# Altium footprint library LION.PcbLib: 90 footprints (part 1 of 13)
Each footprint in its own frame and in the unit in brackets; x right, y up, seen from the top. Pads: shape width x height; smd on the part's side, far side on the other; paste and mask are expansions set on the pad; w line width, h text height; cw(c..) or ccw(c..) is an arc to the next point about the centre after c.
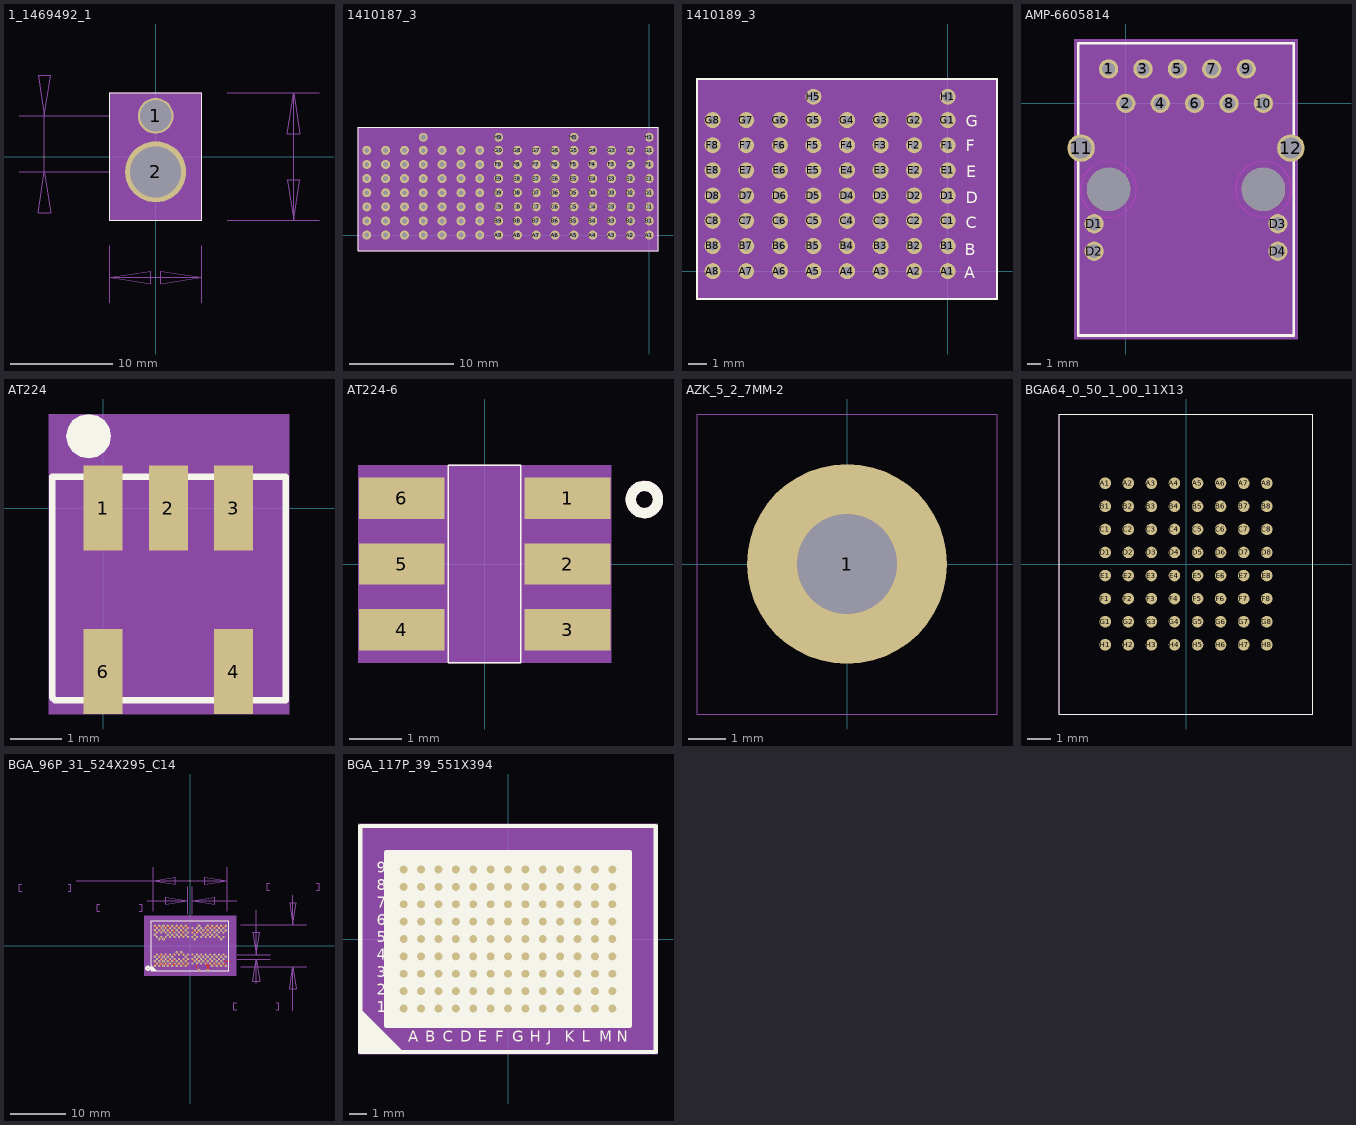
[diagram p0: the footprints below, top view; thin cyan lines are the x and y axes]

## 1_1469492_1 [mm] "1_1469492_1"
pads (2):
  round 3.5 hole 3.1: 1(0,4)
  round 6 / inner round 5.8 / far side round 6 hole 5: 2(0,-1.5)
Top Overlay:
  lines w0.025: -4.5,-6.25 -4.5,6.25 4.5,6.25 4.5,-6.25 -4.5,-6.25
  text ".Designator" at 0,0 h0.64
Mechanical 5:
  lines w0.025: -4.5,-6.25 -4.5,6.25 4.5,6.25 4.5,-6.25 -4.5,-6.25
  text "ZK3" at 2.519,2.054 h0.64
Mechanical 13:
  lines w0.025: -13.414,-1.5 -2.5,-1.5 ; -13.414,4 -2.5,4 ; -4.5,-14.364 -4.5,-8.75 ; 4.5,-14.364 4.5,-8.75 ; 7,-6.25 16.029,-6.25 ; 7,6.25 16.029,6.25 ; -10.914,-1.5 -11.539,-5.5 -10.289,-5.5 -10.914,-1.5 ; -10.914,-1.5 -10.914,0.372 -10.914,4 ; -10.914,4 -10.289,8 -11.539,8 -10.914,4 ; -4.5,-11.864 -0.5,-12.489 -0.5,-11.239 -4.5,-11.864 ; -4.5,-11.864 0.232,-11.864 4.5,-11.864 ; 4.5,-11.864 0.5,-11.239 0.5,-12.489 4.5,-11.864 ; 13.529,-6.25 14.154,-2.25 12.904,-2.25 13.529,-6.25 ; 13.529,-6.25 13.529,0.025 13.529,6.25 ; 13.529,6.25 12.904,2.25 14.154,2.25 13.529,6.25
  text "5.5" at -12.501,-3.958 h3.17
  text "9" at -0.949,-10.277 h3.17
  text "12.5" at 11.942,-5.88 h3.17
Mechanical 14:
  text "2" at 0,-1.297 h0.51
  text "1" at 0,4.203 h0.51
Mechanical 16:
  region: -4.5,-6.25 4.5,-6.25 4.5,6.25 -4.5,6.25
  pour cut-out: -4.5,-6.25 4.5,-6.25 4.5,6.25 -4.5,6.25
  lines w0.025: -4.5,-6.25 -4.5,6.25 4.5,6.25 4.5,-6.25 -4.5,-6.25
3D body: height 3.81, standoff 0, extent -4.5,-6.25 4.5,6.25

## 1410187_3 [mm] "1410187_3"
pads (116):
  round 0.86 hole 0.46: A1(0,0) A2(-1.8,0) A3(-3.6,0) A4(-5.4,0) A5(-7.2,0) A6(-9,0) A7(-10.8,0) A8(-12.6,0) A9(-14.4,0) A10(-16.2,0) A11(-18,0) A12(-19.8,0) A13(-21.6,0) A14(-23.4,0) A15(-25.2,0) A16(-27,0) B1(0,1.35) B2(-1.8,1.35) B3(-3.6,1.35) B4(-5.4,1.35) B5(-7.2,1.35) B6(-9,1.35) B7(-10.8,1.35) B8(-12.6,1.35) B9(-14.4,1.35) B10(-16.2,1.35) B11(-18,1.35) B12(-19.8,1.35) B13(-21.6,1.35) B14(-23.4,1.35) B15(-25.2,1.35) B16(-27,1.35) C1(0,2.7) C2(-1.8,2.7) C3(-3.6,2.7) C4(-5.4,2.7) C5(-7.2,2.7) C6(-9,2.7) C7(-10.8,2.7) C8(-12.6,2.7) C9(-14.4,2.7) C10(-16.2,2.7) C11(-18,2.7) C12(-19.8,2.7) C13(-21.6,2.7) C14(-23.4,2.7) C15(-25.2,2.7) C16(-27,2.7) D1(0,4.05) D2(-1.8,4.05) D3(-3.6,4.05) D4(-5.4,4.05) D5(-7.2,4.05) D6(-9,4.05) D7(-10.8,4.05) D8(-12.6,4.05) D9(-14.4,4.05) D10(-16.2,4.05) D11(-18,4.05) D12(-19.8,4.05) D13(-21.6,4.05) D14(-23.4,4.05) D15(-25.2,4.05) D16(-27,4.05) E1(0,5.4) E2(-1.8,5.4) E3(-3.6,5.4) E4(-5.4,5.4) E5(-7.2,5.4) E6(-9,5.4) E7(-10.8,5.4) E8(-12.6,5.4) E9(-14.4,5.4) E10(-16.2,5.4) E11(-18,5.4) E12(-19.8,5.4) E13(-21.6,5.4) E14(-23.4,5.4) E15(-25.2,5.4) E16(-27,5.4) F1(0,6.75) F2(-1.8,6.75) F3(-3.6,6.75) F4(-5.4,6.75) F5(-7.2,6.75) F6(-9,6.75) F7(-10.8,6.75) F8(-12.6,6.75) F9(-14.4,6.75) F10(-16.2,6.75) F11(-18,6.75) F12(-19.8,6.75) F13(-21.6,6.75) F14(-23.4,6.75) F15(-25.2,6.75) F16(-27,6.75) G1(0,8.1) G2(-1.8,8.1) G3(-3.6,8.1) G4(-5.4,8.1) G5(-7.2,8.1) G6(-9,8.1) G7(-10.8,8.1) G8(-12.6,8.1) G9(-14.4,8.1) G10(-16.2,8.1) G11(-18,8.1) G12(-19.8,8.1) G13(-21.6,8.1) G14(-23.4,8.1) G15(-25.2,8.1) G16(-27,8.1)
  round 0.86 hole 0.56: H1(0,9.35) H5(-7.2,9.35) H9(-14.4,9.35) H13(-21.6,9.35)
Top Overlay:
  lines w0.1: -27.84,-1.5 0.84,-1.5 0.84,10.31 -27.84,10.31 -27.84,-1.5
  text ".Designator" at -20.738,11.425 h0.64
Mechanical 5:
  lines w0.1: -27.84,-1.5 0.84,-1.5 0.84,10.31 -27.84,10.31 -27.84,-1.5
  text "VPX5" at -20.738,11.425 h0.64
Mechanical 14:
  text "B9" at -14.4,1.756 h0.51
  text "A9" at -14.4,0.406 h0.51
  text "C8" at -12.6,3.106 h0.51
  text "B8" at -12.6,1.756 h0.51
  text "E15" at -25.2,6.009 h0.51
  text "D15" at -25.2,4.659 h0.51
  text "G9" at -14.4,8.506 h0.51
  text "G11" at -18,8.709 h0.51
  text "G13" at -21.6,8.709 h0.51
  text "G15" at -25.2,8.709 h0.51
  text "D5" at -7.2,4.456 h0.51
  text "D11" at -18,4.659 h0.51
  text "D3" at -3.6,4.456 h0.51
  text "F6" at -9,7.156 h0.51
  text "B5" at -7.2,1.756 h0.51
  text "B10" at -16.2,1.959 h0.51
  text "A1" at 0,0.406 h0.51
  text "B4" at -5.4,1.756 h0.51
  text "E3" at -3.6,5.806 h0.51
  text "E11" at -18,6.009 h0.51
  text "E9" at -14.4,5.806 h0.51
  text "F12" at -19.8,7.359 h0.51
  text "A11" at -18,0.61 h0.51
  text "E10" at -16.2,6.009 h0.51
  text "C10" at -16.2,3.309 h0.51
  text "E5" at -7.2,5.806 h0.51
  text "C4" at -5.4,3.106 h0.51
  text "D9" at -14.4,4.456 h0.51
  text "F4" at -5.4,7.156 h0.51
  text "E12" at -19.8,6.009 h0.51
  text "E6" at -9,5.806 h0.51
  text "B2" at -1.8,1.756 h0.51
  text "A5" at -7.2,0.406 h0.51
  text "E2" at -1.8,5.806 h0.51
  text "E4" at -5.4,5.806 h0.51
  text "C2" at -1.8,3.106 h0.51
  text "D1" at 0,4.456 h0.51
  text "B6" at -9,1.756 h0.51
  text "C12" at -19.8,3.309 h0.51
  text "B3" at -3.6,1.756 h0.51
  text "C6" at -9,3.106 h0.51
  text "F10" at -16.2,7.359 h0.51
  text "A3" at -3.6,0.406 h0.51
  text "B11" at -18,1.959 h0.51
  text "F2" at -1.8,7.156 h0.51
  text "E1" at 0,5.806 h0.51
  text "B16" at -27,1.959 h0.51
  text "C16" at -27,3.309 h0.51
  text "E16" at -27,6.009 h0.51
  text "F16" at -27,7.359 h0.51
  text "B12" at -19.8,1.959 h0.51
  text "B1" at 0,1.756 h0.51
  text "A13" at -21.6,0.61 h0.51
  text "B13" at -21.6,1.959 h0.51
  text "D13" at -21.6,4.659 h0.51
  text "E13" at -21.6,6.009 h0.51
  text "B14" at -23.4,1.959 h0.51
  text "C14" at -23.4,3.309 h0.51
  text "E14" at -23.4,6.009 h0.51
  text "F14" at -23.4,7.359 h0.51
  text "A15" at -25.2,0.61 h0.51
  text "B15" at -25.2,1.959 h0.51
  text "F8" at -12.6,7.156 h0.51
  text "E8" at -12.6,5.806 h0.51
  text "E7" at -10.8,5.806 h0.51
  text "D7" at -10.8,4.456 h0.51
  text "B7" at -10.8,1.756 h0.51
  text "A7" at -10.8,0.406 h0.51
  text "G7" at -10.8,8.506 h0.51
  text "G5" at -7.2,8.506 h0.51
  text "G3" at -3.6,8.506 h0.51
  text "G1" at 0,8.506 h0.51
  text "H1" at 0,9.756 h0.51
  text "H5" at -7.2,9.756 h0.51
  text "H9" at -14.4,9.756 h0.51
  text "H13" at -21.6,9.959 h0.51
  text "D16" at -27,4.659 h0.51
  text "G16" at -27,8.709 h0.51
  text "A16" at -27,0.61 h0.51
  text "C11" at -18,3.309 h0.51
  text "C13" at -21.6,3.309 h0.51
  text "C15" at -25.2,3.309 h0.51
  text "D12" at -19.8,4.659 h0.51
  text "D14" at -23.4,4.659 h0.51
  text "F11" at -18,7.359 h0.51
  text "F13" at -21.6,7.359 h0.51
  text "F15" at -25.2,7.359 h0.51
  text "G12" at -19.8,8.709 h0.51
  text "G14" at -23.4,8.709 h0.51
  text "A12" at -19.8,0.61 h0.51
  text "A14" at -23.4,0.61 h0.51
  text "C7" at -10.8,3.106 h0.51
  text "C9" at -14.4,3.106 h0.51
  text "D6" at -9,4.456 h0.51
  text "D8" at -12.6,4.456 h0.51
  text "D10" at -16.2,4.659 h0.51
  text "F7" at -10.8,7.156 h0.51
  text "F9" at -14.4,7.156 h0.51
  text "G6" at -9,8.506 h0.51
  text "G8" at -12.6,8.506 h0.51
  text "G10" at -16.2,8.709 h0.51
  text "A6" at -9,0.406 h0.51
  text "A8" at -12.6,0.406 h0.51
  text "A10" at -16.2,0.61 h0.51
  text "C1" at 0,3.106 h0.51
  text "C3" at -3.6,3.106 h0.51
  text "C5" at -7.2,3.106 h0.51
  text "D2" at -1.8,4.456 h0.51
  text "D4" at -5.4,4.456 h0.51
  text "F1" at 0,7.156 h0.51
  text "F3" at -3.6,7.156 h0.51
  text "F5" at -7.2,7.156 h0.51
  text "G2" at -1.8,8.506 h0.51
  text "G4" at -5.4,8.506 h0.51
  text "A2" at -1.8,0.406 h0.51
  text "A4" at -5.4,0.406 h0.51
Mechanical 16:
  pour cut-out: -27.84,-1.5 0.84,-1.5 0.84,10.31 -27.84,10.31
  region: -27.84,-1.5 0.84,-1.5 0.84,10.31 -27.84,10.31
  lines w0.025: -27.84,-1.5 0.84,-1.5 0.84,10.31 -27.84,10.31 -27.84,-1.5
3D body: height 3.81, standoff 0, extent -27.84,-1.5 0.84,10.31

## 1410189_3 [mm] "1410189_3"
pads (58):
  round 0.86 hole 0.46: A1(0,0) A2(-1.8,0) A3(-3.6,0) A4(-5.4,0) A5(-7.2,0) A6(-9,0) A7(-10.8,0) A8(-12.6,0) B1(0,1.35) B2(-1.8,1.35) B3(-3.6,1.35) B4(-5.4,1.35) B5(-7.2,1.35) B6(-9,1.35) B7(-10.8,1.35) B8(-12.6,1.35) C1(0,2.7) C2(-1.8,2.7) C3(-3.6,2.7) C4(-5.4,2.7) C5(-7.2,2.7) C6(-9,2.7) C7(-10.8,2.7) C8(-12.6,2.7) D1(0,4.05) D2(-1.8,4.05) D3(-3.6,4.05) D4(-5.4,4.05) D5(-7.2,4.05) D6(-9,4.05) D7(-10.8,4.05) D8(-12.6,4.05) E1(0,5.4) E2(-1.8,5.4) E3(-3.6,5.4) E4(-5.4,5.4) E5(-7.2,5.4) E6(-9,5.4) E7(-10.8,5.4) E8(-12.6,5.4) F1(0,6.75) F2(-1.8,6.75) F3(-3.6,6.75) F4(-5.4,6.75) F5(-7.2,6.75) F6(-9,6.75) F7(-10.8,6.75) F8(-12.6,6.75) G1(0,8.1) G2(-1.8,8.1) G3(-3.6,8.1) G4(-5.4,8.1) G5(-7.2,8.1) G6(-9,8.1) G7(-10.8,8.1) G8(-12.6,8.1)
  round 0.86 hole 0.56: H1(0,9.35) H5(-7.2,9.35)
Top Overlay:
  lines w0.1: -13.44,-1.5 -13.44,10.31 2.64,10.31 2.64,-1.5 -13.44,-1.5
  text ".Designator" at -5.396,11.044 h0.64
  text "A" at 0.873,-0.39 h0.64
  text "B" at 0.917,0.848 h0.64
  text "C" at 0.961,2.307 h0.64
  text "D" at 0.961,3.633 h0.64
  text "E" at 1.005,5.048 h0.64
  text "F" at 0.961,6.418 h0.64
  text "G" at 0.961,7.744 h0.64
Mechanical 5:
  lines w0.1: -13.44,-1.5 2.64,-1.5 2.64,10.31 -13.44,10.31 -13.44,-1.5
  text "G" at 0.961,7.744 h0.64
  text "F" at 0.961,6.418 h0.64
  text "E" at 1.005,5.048 h0.64
  text "D" at 0.961,3.633 h0.64
  text "C" at 0.961,2.307 h0.64
  text "B" at 0.917,0.848 h0.64
  text "A" at 0.873,-0.39 h0.64
  text "VPX4" at -5.396,11.044 h0.64
Mechanical 14:
  text "A1" at 0,0.406 h0.51
  text "A2" at -1.8,0.406 h0.51
  text "B1" at 0,1.756 h0.51
  text "B2" at -1.8,1.756 h0.51
  text "C1" at 0,3.106 h0.51
  text "C2" at -1.8,3.106 h0.51
  text "E1" at 0,5.806 h0.51
  text "E2" at -1.8,5.806 h0.51
  text "F1" at 0,7.156 h0.51
  text "F2" at -1.8,7.156 h0.51
  text "G1" at 0,8.506 h0.51
  text "G2" at -1.8,8.506 h0.51
  text "B8" at -12.6,1.756 h0.51
  text "G3" at -3.6,8.506 h0.51
  text "F3" at -3.6,7.156 h0.51
  text "C3" at -3.6,3.106 h0.51
  text "A3" at -3.6,0.406 h0.51
  text "B3" at -3.6,1.756 h0.51
  text "E3" at -3.6,5.806 h0.51
  text "B5" at -7.2,1.756 h0.51
  text "F4" at -5.4,7.156 h0.51
  text "G4" at -5.4,8.506 h0.51
  text "A5" at -7.2,0.406 h0.51
  text "F5" at -7.2,7.156 h0.51
  text "G6" at -9,8.506 h0.51
  text "F6" at -9,7.156 h0.51
  text "B6" at -9,1.756 h0.51
  text "A6" at -9,0.406 h0.51
  text "G5" at -7.2,8.506 h0.51
  text "D5" at -7.2,4.456 h0.51
  text "A4" at -5.4,0.406 h0.51
  text "B4" at -5.4,1.756 h0.51
  text "D6" at -9,4.456 h0.51
  text "D4" at -5.4,4.456 h0.51
  text "D1" at 0,4.456 h0.51
  text "D2" at -1.8,4.456 h0.51
  text "D3" at -3.6,4.456 h0.51
  text "F8" at -12.6,7.156 h0.51
  text "C8" at -12.6,3.106 h0.51
  text "H1" at 0,9.756 h0.51
  text "H5" at -7.2,9.756 h0.51
  text "D7" at -10.8,4.456 h0.51
  text "E7" at -10.8,5.806 h0.51
  text "A7" at -10.8,0.406 h0.51
  text "C7" at -10.8,3.106 h0.51
  text "D8" at -12.6,4.456 h0.51
  text "E8" at -12.6,5.806 h0.51
  text "F7" at -10.8,7.156 h0.51
  text "G7" at -10.8,8.506 h0.51
  text "G8" at -12.6,8.506 h0.51
  text "A8" at -12.6,0.406 h0.51
  text "B7" at -10.8,1.756 h0.51
  text "C4" at -5.4,3.106 h0.51
  text "C5" at -7.2,3.106 h0.51
  text "C6" at -9,3.106 h0.51
  text "E4" at -5.4,5.806 h0.51
  text "E5" at -7.2,5.806 h0.51
  text "E6" at -9,5.806 h0.51
Mechanical 16:
  region: -13.44,-1.5 2.64,-1.5 2.64,10.309 -13.44,10.309
  lines w0.025: -13.44,-1.5 2.64,-1.5 2.64,10.309 -13.44,10.309 -13.44,-1.5
3D body: height 3.81, standoff 0, extent -13.44,-1.5 2.64,10.309

## AMP-6605814 [mil] "AMP-6605814"
pads (18):
  round 56 hole 38: 1(-50,100) 2(0,0) 3(50,100) 4(100,0) 5(150,100) 6(200,0) 7(250,100) 8(300,0) 9(350,100) 10(400,0) D1(-92,-350) D2(-92,-430) D3(442,-350) D4(442,-430)
  round 80 hole 62: 11(-130,-130) 12(480,-130)
  round 126 hole 126: " "(-50,-250) " "(400,-250)
Top Overlay:
  lines w8: -138,-675 488,-675 488,175 -138,175 -138,-675
  text ".Designator" at -163.97,-41.8 h25
Mechanical 5:
  lines w8: -138,-173.26 -138,-675 488,-675 488,-173.26 ; -138,-86.74 -138,175 488,175 488,-86.74
  text "J6" at -163.97,-41.8 h25
Mechanical 14:
  text "12" at 480,-158 h35
  text "11" at -130,-158 h35
  text "D2" at -92,-458 h35
  text "2" at 0,-14 h35
  text "D4" at 442,-458 h35
  text "4" at 100,-14 h35
  text "10" at 400,-28 h35
  text "9" at 350,86 h35
  text "5" at 150,86 h35
  text "6" at 200,-14 h35
  text "3" at 50,86 h35
  text "8" at 300,-14 h35
  text "7" at 250,86 h35
  text "D3" at 442,-378 h35
  text "D1" at -92,-378 h35
  text "1" at -50,86 h35
Mechanical 16:
  region: 500,187 500,-685 -150,-685 -150,187
  lines w1: -138,-675 -138,175 ; -138,-675 488,-675 ; -138,-675 488,-675 ; -138,-675 -138,175 ; -138,175 488,175 ; -138,175 488,175 ; 488,-675 488,175 ; 488,-675 488,175
Multi-Layer keep-out:
  circle w1: c-50,-250 r81
  circle w1: c400,-250 r81
Mechanical 17:
  text "6605814-6" at 0,-500 h40
3D body: height 150, standoff 0, extent -150,-685 500,187

## AT224 [mm] "AT224"
pads (5):
  rect 0.76x1.65 smd: 1(0,0) 2(1.27,0) 3(2.54,0) 4(2.54,-3.18) 6(0,-3.18)
Top Overlay:
  pour cut-out: -0.71,1.397 -0.678,1.232 -0.584,1.092 -0.444,0.999 -0.279,0.966 -0.114,0.999 0.025,1.092 0.119,1.232 0.152,1.397 0.119,1.562 0.025,1.702 -0.114,1.795 -0.279,1.828 -0.444,1.795 -0.584,1.702 -0.678,1.562
  lines w0.127: -0.991,-3.683 -0.94,-3.734 3.556,-3.734 3.556,0.61 -0.991,0.61 -0.991,-3.683
Mechanical 5:
  lines w0.127: -0.443,-3.734 -0.94,-3.734 -0.991,-3.683 -0.991,0.61 -0.443,0.61 ; 0.443,-3.734 2.097,-3.734 ; 0.443,0.61 0.827,0.61 ; 1.713,0.61 2.097,0.61 ; 2.983,-3.734 3.556,-3.734 3.556,0.61 2.983,0.61
Mechanical 14:
  text "4" at 3.048,-3.18 h0.64
  text "2" at 1.778,0 h0.64
  text "6" at 0.508,-3.18 h0.64
  text "3" at 3.048,0 h0.64
  text "1" at 0.508,0 h0.64
Mechanical 16:
  region: -1.054,-4.005 3.619,-4.005 3.619,1.82 -1.054,1.82
3D body: height 3.81, standoff 0, extent -1.054,-4.005 3.619,1.82

## AT224-6 [mil] "AT224-6"
pads (6):
  rect 65x31.5 smd: 1(62.99,50) 2(62.99,0) 3(62.99,-50) 4(-62.99,-50) 5(-62.99,0) 6(-62.99,50)
Top Overlay:
  circle w7.87: c121.39,48.97 r10.31
  lines w1: -27.56,-74.8 27.56,-74.8 27.56,74.8 -27.56,74.8 -27.56,-74.8
Mechanical 5:
  lines w1: -27.56,-74.8 27.56,-74.8 27.56,74.8 -27.56,74.8 -27.56,-74.8
  lines w7.87: 131.07,45.41 cw(c121.39,48.97) 121.39,38.66 cw(c121.39,48.97) 111.08,48.97 cw(c121.39,48.97) 121.39,59.28 cw(c121.39,48.97) 131.07,52.53
  text "T1" at 14.95,90.16 h25
Mechanical 14:
  text "5" at -62.99,-24.88 h31.1
  text "1" at 62.99,26.38 h59.06
  text "6" at -62.99,26.38 h59.06
  text "4" at -62.99,-73.62 h59.06
  text "2" at 62.99,-23.62 h59.06
  text "3" at 62.99,-73.62 h59.06
Mechanical 16:
  pour cut-out: -96.07,-74.8 96.06,-74.8 96.06,74.8 -96.07,74.8
  region: -96.07,-74.8 96.06,-74.8 96.06,74.8 -96.07,74.8
  lines w1: -27.56,-74.8 27.56,-74.8 27.56,74.8 -27.56,74.8 -27.56,-74.8
Mechanical 17:
  text ".Designator" at 153.59,-53.58 h25
3D body: height 150, standoff 0, extent -96.07,-74.8 96.06,74.8

## AZK_5_2_7MM-2 [mil] "AZK_5_2_7MM-2"
pads (1):
  round 212.6 / inner round 125.98 / far side round 212.6 hole 106.3: 1(0,0)
Mechanical 14:
  text "1" at -8,0 h20
Mechanical 16:
  pour cut-out: 100.48,0 98.55,19.6 92.83,38.45 83.55,55.83 71.05,71.05 55.83,83.55 38.45,92.83 19.6,98.55 0,100.48 -19.6,98.55 -38.45,92.83 -55.83,83.55 -71.05,71.05 -83.55,55.83 -92.83,38.45 -98.55,19.6 -100.48,0 -98.55,-19.6 -92.83,-38.45 -83.55,-55.83 -71.05,-71.05 -55.83,-83.55 -38.45,-92.83 -19.6,-98.55 0,-100.48 19.6,-98.55 38.45,-92.83 55.83,-83.55 71.05,-71.05 83.55,-55.83 92.83,-38.45 98.55,-19.6
  lines w1: -159.45,-159.45 159.45,-159.45 159.45,159.45 -159.45,159.45 -159.45,-159.45
3D body: height 150, standoff 0, extent -100.48,-100.48 100.48,100.48

## BGA64_0_50_1_00_11X13 [mil] "BGA64_0_50_1_00_11X13"
pads (64):
  round 19.68 smd: A1(-137.8,137.8) A2(-98.43,137.8) A3(-59.06,137.8) A4(-19.69,137.8) A5(19.69,137.8) A6(59.06,137.8) A7(98.43,137.8) A8(137.8,137.8) B1(-137.8,98.43) B2(-98.43,98.43) B3(-59.06,98.43) B4(-19.69,98.43) B5(19.69,98.43) B6(59.06,98.43) B7(98.43,98.43) B8(137.8,98.43) C1(-137.8,59.06) C2(-98.43,59.06) C3(-59.06,59.06) C4(-19.69,59.06) C5(19.69,59.06) C6(59.06,59.06) C7(98.43,59.06) C8(137.8,59.06) D1(-137.8,19.69) D2(-98.43,19.69) D3(-59.06,19.69) D4(-19.69,19.69) D5(19.69,19.69) D6(59.06,19.69) D7(98.43,19.69) D8(137.8,19.69) E1(-137.8,-19.69) E2(-98.43,-19.69) E3(-59.06,-19.69) E4(-19.69,-19.69) E5(19.69,-19.69) E6(59.06,-19.69) E7(98.43,-19.69) E8(137.8,-19.69) F1(-137.8,-59.06) F2(-98.43,-59.06) F3(-59.06,-59.06) F4(-19.69,-59.06) F5(19.69,-59.06) F6(59.06,-59.06) F7(98.43,-59.06) F8(137.8,-59.06) G1(-137.8,-98.43) G2(-98.43,-98.43) G3(-59.06,-98.43) G4(-19.69,-98.43) G5(19.69,-98.43) G6(59.06,-98.43) G7(98.43,-98.43) G8(137.8,-98.43) H1(-137.8,-137.8) H2(-98.43,-137.8) H3(-59.06,-137.8) H4(-19.69,-137.8) H5(19.69,-137.8) H6(59.06,-137.8) H7(98.43,-137.8) H8(137.8,-137.8)
Top Overlay:
  lines w1: -216.54,-255.91 216.54,-255.91 216.54,255.91 -216.54,255.91 -216.54,-255.91
Mechanical 5:
  lines w1: -216.54,-255.91 216.54,-255.91 216.54,255.91 -216.54,255.91 -216.54,-255.91
  text "U7" at -7.57,269.12 h25
Mechanical 14:
  text "F1" at -153.8,-59.06 h20
  text "D8" at 121.8,19.69 h20
  text "A1" at -153.8,137.8 h20
  text "A8" at 121.8,137.8 h20
  text "H1" at -153.8,-137.8 h20
  text "H8" at 121.8,-137.8 h20
  text "C1" at -153.8,59.06 h20
  text "D1" at -153.8,19.69 h20
  text "E1" at -153.8,-19.69 h20
  text "G1" at -153.8,-98.43 h20
  text "G8" at 121.8,-98.43 h20
  text "F8" at 121.8,-59.06 h20
  text "B1" at -153.8,98.43 h20
  text "F7" at 82.43,-59.06 h20
  text "B4" at -35.69,98.43 h20
  text "B5" at 3.69,98.43 h20
  text "C8" at 121.8,59.06 h20
  text "E2" at -114.43,-19.69 h20
  text "B8" at 121.8,98.43 h20
  text "C5" at 3.69,59.06 h20
  text "D4" at -35.69,19.69 h20
  text "D5" at 3.69,19.69 h20
  text "C4" at -35.69,59.06 h20
  text "B3" at -75.06,98.43 h20
  text "H3" at -75.06,-137.8 h20
  text "E4" at -35.69,-19.69 h20
  text "H4" at -35.69,-137.8 h20
  text "E6" at 43.06,-19.69 h20
  text "H5" at 3.69,-137.8 h20
  text "B7" at 82.43,98.43 h20
  text "H6" at 43.06,-137.8 h20
  text "A7" at 82.43,137.8 h20
  text "E5" at 3.69,-19.69 h20
  text "E3" at -75.06,-19.69 h20
  text "B2" at -114.43,98.43 h20
  text "D6" at 43.06,19.69 h20
  text "B6" at 43.06,98.43 h20
  text "D2" at -114.43,19.69 h20
  text "E7" at 82.43,-19.69 h20
  text "C3" at -75.06,59.06 h20
  text "A6" at 43.06,137.8 h20
  text "D3" at -75.06,19.69 h20
  text "D7" at 82.43,19.69 h20
  text "A3" at -75.06,137.8 h20
  text "A2" at -114.43,137.8 h20
  text "C6" at 43.06,59.06 h20
  text "C2" at -114.43,59.06 h20
  text "C7" at 82.43,59.06 h20
  text "G2" at -114.43,-98.43 h20
  text "A5" at 3.69,137.8 h20
  text "F4" at -35.69,-59.06 h20
  text "G7" at 82.43,-98.43 h20
  text "F6" at 43.06,-59.06 h20
  text "A4" at -35.69,137.8 h20
  text "F2" at -114.43,-59.06 h20
  text "G4" at -35.69,-98.43 h20
  text "F5" at 3.69,-59.06 h20
  text "F3" at -75.06,-59.06 h20
  text "G3" at -75.06,-98.43 h20
  text "G6" at 43.06,-98.43 h20
  text "G5" at 3.69,-98.43 h20
  text "H2" at -114.43,-137.8 h20
  text "E8" at 121.8,-19.69 h20
  text "H7" at 82.43,-137.8 h20
Mechanical 16:
  lines w1: -216.54,-255.91 216.54,-255.91 ; -216.54,-255.91 -216.54,255.91 ; -216.54,-255.91 216.54,-255.91 ; -216.54,-255.91 -216.54,255.91 ; -216.54,-255.91 216.54,-255.91 ; -216.54,-255.91 -216.54,255.91 ; -216.54,255.91 216.54,255.91 ; -216.54,255.91 216.54,255.91 ; -216.54,255.91 216.54,255.91 ; 216.54,-255.91 216.54,255.91 ; 216.54,-255.91 216.54,255.91 ; 216.54,-255.91 216.54,255.91
Mechanical 17:
  text ".Designator" at -39.99,-16.67 h50

## BGA_96P_31_524X295_C14 [mil] "BGA_96P_31_524X295_C14"
pads (96):
  round 14 smd: A1(-236.22,-125.98) A2(-236.22,-94.49) A3(-236.22,-62.99) A7(-236.22,62.99) A8(-236.22,94.49) A9(-236.22,125.98) B1(-204.72,-125.98) B2(-204.72,-94.49) B3(-204.72,-62.99) B7(-204.72,62.99) B8(-204.72,94.49) B9(-204.72,125.98) C1(-173.23,-125.98) C2(-173.23,-94.49) C3(-173.23,-62.99) C7(-173.23,62.99) C8(-173.23,94.49) C9(-173.23,125.98) D1(-141.73,-125.98) D2(-141.73,-94.49) D3(-141.73,-62.99) D7(-141.73,62.99) D8(-141.73,94.49) D9(-141.73,125.98) E1(-110.24,-125.98) E2(-110.24,-94.49) E3(-110.24,-62.99) E7(-110.24,62.99) E8(-110.24,94.49) E9(-110.24,125.98) F1(-78.74,-125.98) F2(-78.74,-94.49) F3(-78.74,-62.99) F7(-78.74,62.99) F8(-78.74,94.49) F9(-78.74,125.98) G1(-47.24,-125.98) G2(-47.24,-94.49) G3(-47.24,-62.99) G7(-47.24,62.99) G8(-47.24,94.49) G9(-47.24,125.98) H1(-15.75,-125.98) H2(-15.75,-94.49) H3(-15.75,-62.99) H7(-15.75,62.99) H8(-15.75,94.49) H9(-15.75,125.98) J1(15.75,-125.98) J2(15.75,-94.49) J3(15.75,-62.99) J7(15.75,62.99) J8(15.75,94.49) J9(15.75,125.98) K1(47.24,-125.98) K2(47.24,-94.49) K3(47.24,-62.99) K7(47.24,62.99) K8(47.24,94.49) K9(47.24,125.98) L1(78.74,-125.98) L2(78.74,-94.49) L3(78.74,-62.99) L7(78.74,62.99) L8(78.74,94.49) L9(78.74,125.98) M1(110.24,-125.98) M2(110.24,-94.49) M3(110.24,-62.99) M7(110.24,62.99) M8(110.24,94.49) M9(110.24,125.98) N1(141.73,-125.98) N2(141.73,-94.49) N3(141.73,-62.99) N7(141.73,62.99) N8(141.73,94.49) N9(141.73,125.98) P1(173.23,-125.98) P2(173.23,-94.49) P3(173.23,-62.99) P7(173.23,62.99) P8(173.23,94.49) P9(173.23,125.98) R1(204.72,-125.98) R2(204.72,-94.49) R3(204.72,-62.99) R7(204.72,62.99) R8(204.72,94.49) R9(204.72,125.98) T1(236.22,-125.98) T2(236.22,-94.49) T3(236.22,-62.99) T7(236.22,62.99) T8(236.22,94.49) T9(236.22,125.98)
via 220.46,-141.72 diameter 18 hole 10
via 220.46,141.72 diameter 18 hole 10
via -94.48,-141.72 diameter 18 hole 10
via -157.47,-110.23 diameter 18 hole 10
via -251.96,-141.72 diameter 18 hole 10
via -220.46,-110.23 diameter 18 hole 10
via -188.97,-141.72 diameter 18 hole 10
via -31.49,-110.23 diameter 18 hole 10
via 62.98,110.23 diameter 18 hole 10
via -125.98,141.72 diameter 18 hole 10
via -157.47,141.72 diameter 18 hole 10
via -188.97,141.72 diameter 18 hole 10
via -251.96,110.23 diameter 18 hole 10
via -62.98,78.73 diameter 18 hole 10
via -31.49,141.72 diameter 18 hole 10
via 62.98,-110.23 diameter 18 hole 10
via 157.47,-141.72 diameter 18 hole 10
via 157.47,141.72 diameter 18 hole 10
via -31.49,-141.72 diameter 18 hole 10
via 125.98,110.23 diameter 18 hole 10
via -157.47,-78.73 diameter 18 hole 10
via -125.98,78.73 diameter 18 hole 10
via 125.98,-110.23 diameter 18 hole 10
via 62.98,141.72 diameter 18 hole 10
via 62.98,-78.73 diameter 18 hole 10
via 31.49,78.73 diameter 18 hole 10
via 31.49,47.24 diameter 18 hole 10
via 31.49,-78.73 diameter 18 hole 10
via 94.49,-78.74 diameter 18 hole 10
via 125.98,-78.73 diameter 18 hole 10
via 94.48,-110.23 diameter 18 hole 10
via 157.47,110.23 diameter 18 hole 10
via 94.48,110.23 diameter 18 hole 10
via -188.97,47.24 diameter 18 hole 10
via -62.98,-47.24 diameter 18 hole 10
via 62.98,-173.21 diameter 18 hole 10
via 220.46,-110.23 diameter 18 hole 10
via 220.46,47.24 diameter 18 hole 10
via 94.49,78.74 diameter 18 hole 10
via -31.49,110.23 diameter 18 hole 10
via -220.46,110.23 diameter 18 hole 10
via 188.97,-78.73 diameter 18 hole 10
via -188.97,110.23 diameter 18 hole 10
via -94.48,-110.23 diameter 18 hole 10
via 157.47,-78.73 diameter 18 hole 10
via 220.46,110.23 diameter 18 hole 10
via -31.49,78.73 diameter 18 hole 10
via -251.96,-110.23 diameter 18 hole 10
via -62.98,-110.23 diameter 18 hole 10
via 157.47,-110.23 diameter 18 hole 10
via -188.97,-110.23 diameter 18 hole 10
via 251.97,-78.74 diameter 18 hole 10
via 188.97,78.73 diameter 18 hole 10
via 251.96,110.23 diameter 18 hole 10
via -157.47,78.73 diameter 18 hole 10
via -188.97,-78.73 diameter 18 hole 10
via 125.98,78.73 diameter 18 hole 10
via -94.49,78.74 diameter 18 hole 10
via 157.47,78.73 diameter 18 hole 10
via 220.46,-78.73 diameter 18 hole 10
via -94.48,110.23 diameter 18 hole 10
via -251.97,78.74 diameter 18 hole 10
via -251.97,-78.74 diameter 18 hole 10
via -125.98,-78.73 diameter 18 hole 10
via 188.97,-110.23 diameter 18 hole 10
via -31.49,-78.73 diameter 18 hole 10
via 188.97,110.23 diameter 18 hole 10
via -94.49,-47.25 diameter 18 hole 10
via -220.46,47.24 diameter 18 hole 10
via -220.46,-141.72 diameter 18 hole 10
via -157.47,-141.72 diameter 18 hole 10
via -125.98,-110.23 diameter 18 hole 10
via -125.98,-141.72 diameter 18 hole 10
via -62.98,-141.72 diameter 18 hole 10
via -157.47,110.23 diameter 18 hole 10
via -125.98,110.23 diameter 18 hole 10
via -94.48,141.72 diameter 18 hole 10
via -62.98,141.72 diameter 18 hole 10
via -62.98,110.23 diameter 18 hole 10
via -220.46,-78.73 diameter 18 hole 10
via -220.46,141.72 diameter 18 hole 10
via -251.96,141.72 diameter 18 hole 10
via 31.49,-110.23 diameter 18 hole 10
via 125.98,-173.21 diameter 18 hole 10
via 188.97,-141.72 diameter 18 hole 10
via 251.96,-141.72 diameter 18 hole 10
via 31.49,110.23 diameter 18 hole 10
via 125.98,141.72 diameter 18 hole 10
via 188.97,141.72 diameter 18 hole 10
via 251.96,141.72 diameter 18 hole 10
Top Layer:
  lines w5: -251.96,-110.23 -236.22,-94.49 ; -251.97,-78.74 -236.22,-62.99 ; -251.97,78.74 -236.22,62.99 ; -220.46,110.23 -204.72,94.49 ; -204.72,62.99 -220.46,47.25 ; -188.97,-110.23 -173.23,-94.49 ; -188.97,-78.73 -173.23,-62.99 ; -188.97,110.23 -173.23,94.49 ; -173.23,62.99 -188.97,47.25 ; -157.47,-78.73 -141.73,-62.99 ; -157.47,78.73 -141.73,62.99 ; -125.98,-78.73 -110.24,-62.99 ; -125.98,78.73 -110.24,62.99 ; -94.48,-110.23 -78.74,-94.49 ; -94.49,78.74 -78.74,62.99 ; -94.48,110.23 -78.74,94.49 ; -78.74,-62.99 -94.48,-47.25 ; -62.98,-110.23 -47.24,-94.49 ; -47.24,-62.99 -62.98,-47.25 ; -31.49,-78.73 -15.75,-62.99 ; -31.49,78.73 -15.75,62.99 ; -31.49,110.23 -15.75,94.49 ; 15.75,62.99 31.49,78.73 ; 31.49,47.24 47.24,62.99 ; 47.24,125.98 62.98,141.72 ; 78.74,62.99 94.49,78.74 ; 78.74,94.49 94.48,110.23 ; 141.73,62.99 157.47,78.73 ; 141.73,94.49 157.47,110.23 ; 173.23,62.99 188.97,78.73 ; 173.23,94.49 188.97,110.23 ; 204.72,62.99 220.46,47.25 ; 204.72,94.49 220.46,110.23 ; 236.22,94.49 251.96,110.23 ; -220.46,47.24 -220.46,47.25 ; -188.97,47.24 -188.97,47.25 ; -94.49,-47.25 -94.48,-47.25 ; -62.98,-47.25 -62.98,-47.24 ; 220.46,47.24 220.46,47.25
  lines w6: 15.75,-62.99 31.49,-78.73 ; 47.24,-125.98 47.24,-157.47 62.98,-173.21 ; 47.24,-62.99 62.98,-78.73 ; 78.74,-94.49 94.48,-110.23 ; 78.74,-62.99 94.49,-78.74 ; 110.24,-94.49 125.98,-110.23 ; 110.24,-62.99 125.98,-78.73 ; 110.24,62.99 125.98,78.73 ; 141.73,-94.49 157.47,-110.23 ; 141.73,-62.99 157.47,-78.73 ; 173.23,-94.49 188.97,-110.23 ; 173.23,-62.99 188.97,-78.73 ; 204.72,-94.49 220.46,-110.23 ; 204.72,-62.99 220.46,-78.73 ; 236.22,-94.49 251.96,-110.23 283.45,-110.23 ; 236.22,-62.99 251.97,-78.74
  lines w15: -251.96,-141.72 -236.22,-125.98 ; -251.96,110.23 -236.22,94.49 ; -251.96,141.72 -236.22,125.98 ; -220.46,-141.72 -204.72,-125.98 ; -220.46,-110.23 -204.72,-94.49 ; -220.46,-78.73 -204.72,-62.99 ; -220.46,141.72 -204.72,125.98 ; -188.97,-141.72 -173.23,-125.98 ; -188.97,141.72 -173.23,125.98 ; -157.47,-141.72 -141.73,-125.98 ; -157.47,-110.23 -141.73,-94.49 ; -157.47,110.23 -141.73,94.49 ; -157.47,141.72 -141.73,125.98 ; -125.98,-141.72 -110.24,-125.98 ; -125.98,-110.23 -110.24,-94.49 ; -125.98,110.23 -110.24,94.49 ; -125.98,141.72 -110.24,125.98 ; -94.48,-141.72 -78.74,-125.98 ; -94.48,141.72 -78.74,125.98 ; -62.98,-141.72 -47.24,-125.98 ; -62.98,78.73 -47.24,62.99 ; -62.98,110.23 -47.24,94.49 ; -62.98,141.72 -47.24,125.98 ; -31.49,-141.72 -15.75,-125.98 ; -31.49,-110.23 -15.75,-94.49 ; -31.49,141.72 -15.75,125.98 ; 15.75,-94.49 31.49,-110.23 ; 15.75,94.49 31.49,110.23 ; 47.24,-94.49 62.98,-110.23 ; 47.24,94.49 62.98,110.23 ; 110.24,-125.98 125.98,-141.72 125.98,-173.21 ; 110.24,94.49 125.98,110.23 ; 110.24,125.98 125.98,141.72 ; 141.73,-125.98 157.47,-141.72 ; 141.73,125.98 157.47,141.72 ; 173.23,-125.98 188.97,-141.72 ; 173.23,125.98 188.97,141.72 ; 204.72,-125.98 220.46,-141.72 ; 204.72,125.98 220.46,141.72 ; 236.22,-125.98 251.96,-141.72 ; 236.22,125.98 251.96,141.72
Top Overlay:
  circle w15: c-300,-160 r11.18
  lines w3.94: -275.98,-142.52 -275.2,-142.52 -241.73,-175.98 -248.82,-175.98 -275.2,-149.61 -275.2,-156.3 -255.12,-176.38 -261.42,-176.38 -274.41,-163.39 -274.41,-170.08 -268.11,-176.38 ; -275.59,-177.16 275.59,-177.16 275.59,177.16 -275.59,177.16 -275.59,-177.16
  text ".Designator" at -327.51,-7.51 h25
Mechanical 1:
  lines w1: -261.81,-147.64 261.81,-147.64 261.81,147.64 -261.81,147.64 -261.81,-147.64
Mechanical 5:
  circle w15: c-300,-160 r11.18
  lines w3.94: -275.98,-142.52 -275.2,-142.52 -241.73,-175.98 -248.82,-175.98 -275.2,-149.61 -275.2,-156.3 -255.12,-176.38 -261.42,-176.38 -274.41,-163.39 -274.41,-170.08 -268.11,-176.38 ; -275.59,-177.16 275.59,-177.16 275.59,177.16 -275.59,177.16 -275.59,-177.16
  text "U4" at -362.51,27.5 h25
Mechanical 13:
  lines w1: -1195.67,385.04 -1214.57,385.04 -1214.57,435.04 -1195.67,435.04 ; -864.57,385.04 -845.67,385.04 -845.67,435.04 -864.57,435.04 ; -807.87,459.84 -261.81,459.84 ; -640.16,244.88 -659.06,244.88 -659.06,294.88 -640.16,294.88 ; -359.84,244.88 -340.94,244.88 -340.94,294.88 -359.84,294.88 ; -303.54,320.08 -15.75,320.08 ; -261.81,246.06 -261.81,558.27 ; -15.75,224.41 -15.75,418.5 ; 15.75,224.41 15.75,418.5 ; 261.81,246.06 261.81,558.27 ; 329.92,-455.12 311.02,-455.12 311.02,-405.12 329.92,-405.12 ; 330.71,320.08 15.75,320.08 ; 334.65,-94.49 568.5,-94.49 ; 334.65,-62.99 568.5,-62.99 ; 360.24,-147.64 828.35,-147.64 ; 360.24,147.64 828.35,147.64 ; 470.08,-267.32 470.08,-94.49 ; 470.08,251.97 470.08,-62.99 ; 564.57,394.88 545.67,394.88 545.67,444.88 564.57,444.88 ; 609.84,-455.12 629.13,-455.12 629.13,-405.12 609.84,-405.12 ; 729.92,-462.6 729.92,-147.64 ; 729.92,357.48 729.92,147.64 ; 895.67,394.88 914.57,394.88 914.57,444.88 895.67,444.88 ; -261.81,459.84 -104.33,484.65 -104.33,435.43 -261.81,459.84 ; -261.81,459.84 261.81,459.84 ; -15.75,320.08 -173.23,295.28 -173.23,344.49 -15.75,320.08 ; 15.75,320.08 173.23,344.49 173.23,295.28 15.75,320.08 ; 261.81,459.84 104.33,435.43 104.33,484.65 261.81,459.84 ; 470.08,-94.49 494.49,-251.97 445.28,-251.97 470.08,-94.49 ; 470.08,-62.99 445.28,94.49 494.49,94.49 470.08,-62.99 ; 729.92,-147.64 754.72,-305.12 705.51,-305.12 729.92,-147.64 ; 729.92,147.64 705.51,305.12 754.72,305.12 729.92,147.64
  text "0.8" at -570.08,344.88 h50
  text "31.50" at -620.87,244.88 h50
  text "0.8" at 400,-355.12 h50
  text "31.50" at 348.82,-455.12 h50
  text "13.3" at -1125.59,485.04 h50
  text "523.62" at -1176.38,385.04 h50
  text "7.5" at 659.84,494.88 h50
  text "295.28" at 583.46,394.88 h50
Mechanical 14:
  text "R1" at 204.72,-105.82 h25.2
  text "R9" at 204.72,146.14 h25.2
  text "F1" at -78.74,-105.82 h25.2
  text "D2" at -141.73,-74.33 h25.2
  text "A1" at -236.22,-105.82 h25.2
  text "B2" at -204.72,-74.33 h25.2
  text "C1" at -173.23,-105.82 h25.2
  text "H2" at -15.75,-74.33 h25.2
  text "K8" at 47.24,114.65 h25.2
  text "E9" at -110.24,146.14 h25.2
  text "D9" at -141.73,146.14 h25.2
  text "C9" at -173.23,146.14 h25.2
  text "A8" at -236.22,114.65 h25.2
  text "G7" at -47.24,83.15 h25.2
  text "H9" at -15.75,146.14 h25.2
  text "K2" at 47.24,-74.33 h25.2
  text "N1" at 141.73,-105.82 h25.2
  text "N9" at 141.73,146.14 h25.2
  text "H1" at -15.75,-105.82 h25.2
  text "M8" at 110.24,114.65 h25.2
  text "D3" at -141.73,-42.83 h25.2
  text "E7" at -110.24,83.15 h25.2
  text "M2" at 110.24,-74.33 h25.2
  text "K9" at 47.24,146.14 h25.2
  text "K3" at 47.24,-42.83 h25.2
  text "J7" at 15.75,83.15 h25.2
  text "K7" at 47.24,83.15 h25.2
  text "J3" at 15.75,-42.83 h25.2
  text "L3" at 78.74,-42.83 h25.2
  text "M3" at 110.24,-42.83 h25.2
  text "L2" at 78.74,-74.33 h25.2
  text "N8" at 141.73,114.65 h25.2
  text "L8" at 78.74,114.65 h25.2
  text "C7" at -173.23,83.15 h25.2
  text "G3" at -47.24,-42.83 h25.2
  text "K1" at 47.24,-105.82 h25.2
  text "T7" at 236.22,83.15 h25.2
  text "R2" at 204.72,-74.33 h25.2
  text "R7" at 204.72,83.15 h25.2
  text "L7" at 78.74,83.15 h25.2
  text "H8" at -15.75,114.65 h25.2
  text "B8" at -204.72,114.65 h25.2
  text "T2" at 236.22,-74.33 h25.2
  text "P3" at 173.23,-42.83 h25.2
  text "C8" at -173.23,114.65 h25.2
  text "F2" at -78.74,-74.33 h25.2
  text "N3" at 141.73,-42.83 h25.2
  text "R8" at 204.72,114.65 h25.2
  text "H7" at -15.75,83.15 h25.2
  text "A2" at -236.22,-74.33 h25.2
  text "G2" at -47.24,-74.33 h25.2
  text "N2" at 141.73,-74.33 h25.2
  text "C2" at -173.23,-74.33 h25.2
  text "T3" at 236.22,-42.83 h25.2
  text "P7" at 173.23,83.15 h25.2
  text "T8" at 236.22,114.65 h25.2
  text "D7" at -141.73,83.15 h25.2
  text "C3" at -173.23,-42.83 h25.2
  text "M7" at 110.24,83.15 h25.2
  text "F7" at -78.74,83.15 h25.2
  text "N7" at 141.73,83.15 h25.2
  text "R3" at 204.72,-42.83 h25.2
  text "F8" at -78.74,114.65 h25.2
  text "A7" at -236.22,83.15 h25.2
  text "A3" at -236.22,-42.83 h25.2
  text "E3" at -110.24,-42.83 h25.2
  text "P2" at 173.23,-74.33 h25.2
  text "H3" at -15.75,-42.83 h25.2
  text "P8" at 173.23,114.65 h25.2
  text "F3" at -78.74,-42.83 h25.2
  text "B7" at -204.72,83.15 h25.2
  text "J1" at 15.75,-105.82 h25.2
  text "J9" at 15.75,146.14 h25.2
  text "L1" at 78.74,-105.82 h25.2
  text "L9" at 78.74,146.14 h25.2
  text "B1" at -204.72,-105.82 h25.2
  text "D1" at -141.73,-105.82 h25.2
  text "E2" at -110.24,-74.33 h25.2
  text "E1" at -110.24,-105.82 h25.2
  text "G1" at -47.24,-105.82 h25.2
  text "D8" at -141.73,114.65 h25.2
  text "E8" at -110.24,114.65 h25.2
  text "F9" at -78.74,146.14 h25.2
  text "G9" at -47.24,146.14 h25.2
  text "G8" at -47.24,114.65 h25.2
  text "B3" at -204.72,-42.83 h25.2
  text "B9" at -204.72,146.14 h25.2
  text "A9" at -236.22,146.14 h25.2
  text "J2" at 15.75,-74.33 h25.2
  text "M1" at 110.24,-105.82 h25.2
  text "P1" at 173.23,-105.82 h25.2
  text "T1" at 236.22,-105.82 h25.2
  text "J8" at 15.75,114.65 h25.2
  text "M9" at 110.24,146.14 h25.2
  text "P9" at 173.23,146.14 h25.2
  text "T9" at 236.22,146.14 h25.2
Mechanical 16:
  pour cut-out: -325.98,-211.81 325.98,-211.81 325.98,211.81 -325.98,211.81
  region: -285,-185 285,-185 285,185 -285,185
3D body: height 150, standoff 0, extent -285,-185 285,185

## BGA_117P_39_551X394 [mil] "BGA_117P_39_551X394"
pads (117):
  round 18 smd: A1(-236.22,-157.48) A2(-236.22,-118.11) A3(-236.22,-78.74) A4(-236.22,-39.37) A5(-236.22,0) A6(-236.22,39.37) A7(-236.22,78.74) A8(-236.22,118.11) A9(-236.22,157.48) B1(-196.85,-157.48) B2(-196.85,-118.11) B3(-196.85,-78.74) B4(-196.85,-39.37) B5(-196.85,0) B6(-196.85,39.37) B7(-196.85,78.74) B8(-196.85,118.11) B9(-196.85,157.48) C1(-157.48,-157.48) C2(-157.48,-118.11) C3(-157.48,-78.74) C4(-157.48,-39.37) C5(-157.48,0) C6(-157.48,39.37) C7(-157.48,78.74) C8(-157.48,118.11) C9(-157.48,157.48) D1(-118.11,-157.48) D2(-118.11,-118.11) D3(-118.11,-78.74) D4(-118.11,-39.37) D5(-118.11,0) D6(-118.11,39.37) D7(-118.11,78.74) D8(-118.11,118.11) D9(-118.11,157.48) E1(-78.74,-157.48) E2(-78.74,-118.11) E3(-78.74,-78.74) E4(-78.74,-39.37) E5(-78.74,0) E6(-78.74,39.37) E7(-78.74,78.74) E8(-78.74,118.11) E9(-78.74,157.48) F1(-39.37,-157.48) F2(-39.37,-118.11) F3(-39.37,-78.74) F4(-39.37,-39.37) F5(-39.37,0) F6(-39.37,39.37) F7(-39.37,78.74) F8(-39.37,118.11) F9(-39.37,157.48) G1(0,-157.48) G2(0,-118.11) G3(0,-78.74) G4(0,-39.37) G5(0,0) G6(0,39.37) G7(0,78.74) G8(0,118.11) G9(0,157.48) H1(39.37,-157.48) H2(39.37,-118.11) H3(39.37,-78.74) H4(39.37,-39.37) H5(39.37,0) H6(39.37,39.37) H7(39.37,78.74) H8(39.37,118.11) H9(39.37,157.48) J1(78.74,-157.48) J2(78.74,-118.11) J3(78.74,-78.74) J4(78.74,-39.37) J5(78.74,0) J6(78.74,39.37) J7(78.74,78.74) J8(78.74,118.11) J9(78.74,157.48) K1(118.11,-157.48) K2(118.11,-118.11) K3(118.11,-78.74) K4(118.11,-39.37) K5(118.11,0) K6(118.11,39.37) K7(118.11,78.74) K8(118.11,118.11) K9(118.11,157.48) L1(157.48,-157.48) L2(157.48,-118.11) L3(157.48,-78.74) L4(157.48,-39.37) L5(157.48,0) L6(157.48,39.37) L7(157.48,78.74) L8(157.48,118.11) L9(157.48,157.48) M1(196.85,-157.48) M2(196.85,-118.11) M3(196.85,-78.74) M4(196.85,-39.37) M5(196.85,0) M6(196.85,39.37) M7(196.85,78.74) M8(196.85,118.11) M9(196.85,157.48) N1(236.22,-157.48) N2(236.22,-118.11) N3(236.22,-78.74) N4(236.22,-39.37) N5(236.22,0) N6(236.22,39.37) N7(236.22,78.74) N8(236.22,118.11) N9(236.22,157.48)
Top Overlay:
  drawing of 127 lines, arcs and shapes, not listed
  text "9" at -297.09,149.61 h25
  text "8" at -297.09,110.24 h25
  text "7" at -297.09,70.87 h25
  text "6" at -297.09,31.5 h25
  text "5" at -297.09,-7.87 h25
  text "4" at -297.09,-47.24 h25
  text "3" at -297.09,-86.61 h25
  text "2" at -297.09,-125.98 h25
  text "N" at 246.22,-232.28 h25
  text "M" at 206.85,-232.28 h25
  text "L" at 167.48,-232.28 h25
  text "K" at 128.11,-232.28 h25
  text "J" at 88.74,-232.28 h25
  text "H" at 49.37,-232.28 h25
  text "G" at 10,-232.28 h25
  text "F" at -29.37,-232.28 h25
  text "E" at -68.74,-232.28 h25
  text "D" at -108.11,-232.28 h25
  text "C" at -147.48,-232.28 h25
  text "B" at -186.85,-232.28 h25
  text "1" at -297.09,-165.35 h25
  text "A" at -226.22,-232.28 h25
Mechanical 1:
  lines w1: -275.59,-196.85 275.59,-196.85 275.59,196.85 -275.59,196.85 -275.59,-196.85
Mechanical 5:
  lines w10: -334.65,-255.91 334.65,-255.91 334.65,255.91 -334.65,255.91 -334.65,-255.91 ; -275.59,-196.85 275.59,-196.85 275.59,196.85 -275.59,196.85 -275.59,-196.85
  text "A" at -226.22,-232.28 h25
  text "1" at -297.09,-165.35 h25
  text "B" at -186.85,-232.28 h25
  text "C" at -147.48,-232.28 h25
  text "D" at -108.11,-232.28 h25
  text "E" at -68.74,-232.28 h25
  text "F" at -29.37,-232.28 h25
  text "G" at 10,-232.28 h25
  text "H" at 49.37,-232.28 h25
  text "J" at 88.74,-232.28 h25
  text "K" at 128.11,-232.28 h25
  text "L" at 167.48,-232.28 h25
  text "M" at 206.85,-232.28 h25
  text "N" at 246.22,-232.28 h25
  text "2" at -297.09,-125.98 h25
  text "3" at -297.09,-86.61 h25
  text "4" at -297.09,-47.24 h25
  text "5" at -297.09,-7.87 h25
  text "6" at -297.09,31.5 h25
  text "7" at -297.09,70.87 h25
  text "8" at -297.09,110.24 h25
  text "9" at -297.09,149.61 h25
  text "U63" at 19.84,-277.25 h25
Mechanical 14:
  text "B5" at -174.45,0 h28
  text "M5" at 219.25,0 h28
  text "M6" at 219.25,39.37 h28
  text "G1" at 22.4,-157.48 h28
  text "K7" at 140.51,78.74 h28
  text "B2" at -174.45,-118.11 h28
  text "D3" at -95.71,-78.74 h28
  text "C3" at -135.08,-78.74 h28
  text "B3" at -174.45,-78.74 h28
  text "C4" at -135.08,-39.37 h28
  text "A1" at -213.82,-157.48 h28
  text "A2" at -213.82,-118.11 h28
  text "C5" at -135.08,0 h28
  text "C1" at -135.08,-157.48 h28
  text "B1" at -174.45,-157.48 h28
  text "D2" at -95.71,-118.11 h28
  text "J9" at 101.14,157.48 h28
  text "H9" at 61.77,157.48 h28
  text "M1" at 219.25,-157.48 h28
  text "L3" at 179.88,-78.74 h28
  text "M2" at 219.25,-118.11 h28
  text "L8" at 179.88,118.11 h28
  text "E1" at -56.34,-157.48 h28
  text "D1" at -95.71,-157.48 h28
  text "G2" at 22.4,-118.11 h28
  text "K3" at 140.51,-78.74 h28
  text "C9" at -135.08,157.48 h28
  text "A5" at -213.82,0 h28
  text "M7" at 219.25,78.74 h28
  text "M4" at 219.25,-39.37 h28
  text "N5" at 258.62,0 h28
  text "B7" at -174.45,78.74 h28
  text "M3" at 219.25,-78.74 h28
  text "M8" at 219.25,118.11 h28
  text "J7" at 101.14,78.74 h28
  text "E7" at -56.34,78.74 h28
  text "D7" at -95.71,78.74 h28
  text "J3" at 101.14,-78.74 h28
  text "F3" at -16.97,-78.74 h28
  text "E3" at -56.34,-78.74 h28
  text "C7" at -135.08,78.74 h28
  text "C6" at -135.08,39.37 h28
  text "D9" at -95.71,157.48 h28
  text "M9" at 219.25,157.48 h28
  text "A6" at -213.82,39.37 h28
  text "J2" at 101.14,-118.11 h28
  text "L9" at 179.88,157.48 h28
  text "F1" at -16.97,-157.48 h28
  text "H2" at 61.77,-118.11 h28
  text "L1" at 179.88,-157.48 h28
  text "G3" at 22.4,-78.74 h28
  text "H8" at 61.77,118.11 h28
  text "J1" at 101.14,-157.48 h28
  text "H1" at 61.77,-157.48 h28
  text "K8" at 140.51,118.11 h28
  text "K2" at 140.51,-118.11 h28
  text "A3" at -213.82,-78.74 h28
  text "F2" at -16.97,-118.11 h28
  text "A4" at -213.82,-39.37 h28
  text "E2" at -56.34,-118.11 h28
  text "L7" at 179.88,78.74 h28
  text "H3" at 61.77,-78.74 h28
  text "F9" at -16.97,157.48 h28
  text "N9" at 258.62,157.48 h28
  text "C8" at -135.08,118.11 h28
  text "N2" at 258.62,-118.11 h28
  text "F8" at -16.97,118.11 h28
  text "N1" at 258.62,-157.48 h28
  text "N6" at 258.62,39.37 h28
  text "A9" at -213.82,157.48 h28
  text "B6" at -174.45,39.37 h28
  text "G7" at 22.4,78.74 h28
  text "E9" at -56.34,157.48 h28
  text "N7" at 258.62,78.74 h28
  text "D8" at -95.71,118.11 h28
  text "N8" at 258.62,118.11 h28
  text "E8" at -56.34,118.11 h28
  text "G9" at 22.4,157.48 h28
  text "G8" at 22.4,118.11 h28
  text "N4" at 258.62,-39.37 h28
  text "N3" at 258.62,-78.74 h28
  text "B8" at -174.45,118.11 h28
  text "J8" at 101.14,118.11 h28
  text "K9" at 140.51,157.48 h28
  text "B9" at -174.45,157.48 h28
  text "F7" at -16.97,78.74 h28
  text "L2" at 179.88,-118.11 h28
  text "B4" at -174.45,-39.37 h28
  text "C2" at -135.08,-118.11 h28
  text "K1" at 140.51,-157.48 h28
  text "A8" at -213.82,118.11 h28
  text "A7" at -213.82,78.74 h28
  text "H7" at 61.77,78.74 h28
  text "H6" at 61.77,39.37 h28
  text "J6" at 101.14,39.37 h28
  text "H5" at 61.77,0 h28
  text "H4" at 61.77,-39.37 h28
  text "J4" at 101.14,-39.37 h28
  text "J5" at 101.14,0 h28
  text "L4" at 179.88,-39.37 h28
  text "L5" at 179.88,0 h28
  text "K6" at 140.51,39.37 h28
  text "L6" at 179.88,39.37 h28
  text "K5" at 140.51,0 h28
  text "K4" at 140.51,-39.37 h28
  text "G6" at 22.4,39.37 h28
  text "D4" at -95.71,-39.37 h28
  text "G5" at 22.4,0 h28
  text "D6" at -95.71,39.37 h28
  text "E5" at -56.34,0 h28
  text "E4" at -56.34,-39.37 h28
  text "F4" at -16.97,-39.37 h28
  text "F5" at -16.97,0 h28
  text "G4" at 22.4,-39.37 h28
  text "F6" at -16.97,39.37 h28
  text "E6" at -56.34,39.37 h28
  text "D5" at -95.71,0 h28
Mechanical 16:
  pour cut-out: -339.65,-260.91 339.65,-260.91 339.65,260.91 -339.65,260.91
  region: -334.65,-255.91 334.65,-255.91 334.65,255.91 -334.65,255.91
  lines w1: -334.65,-255.91 -334.65,255.91 334.65,255.91 334.65,-255.91 -334.65,-255.91
Mechanical 17:
  text ".Designator" at 43.2,12 h36
3D body: height 150, standoff 0, extent -334.65,-255.91 334.65,255.91